# Altium footprint library ATROTECH.PcbLib: 334 footprints (part 9 of 21)
Each footprint in its own frame and in the unit in brackets; x right, y up, seen from the top. Pads: shape width x height; smd on the part's side, far side on the other; paste and mask are expansions set on the pad; w line width, h text height; cw(c..) or ccw(c..) is an arc to the next point about the centre after c.
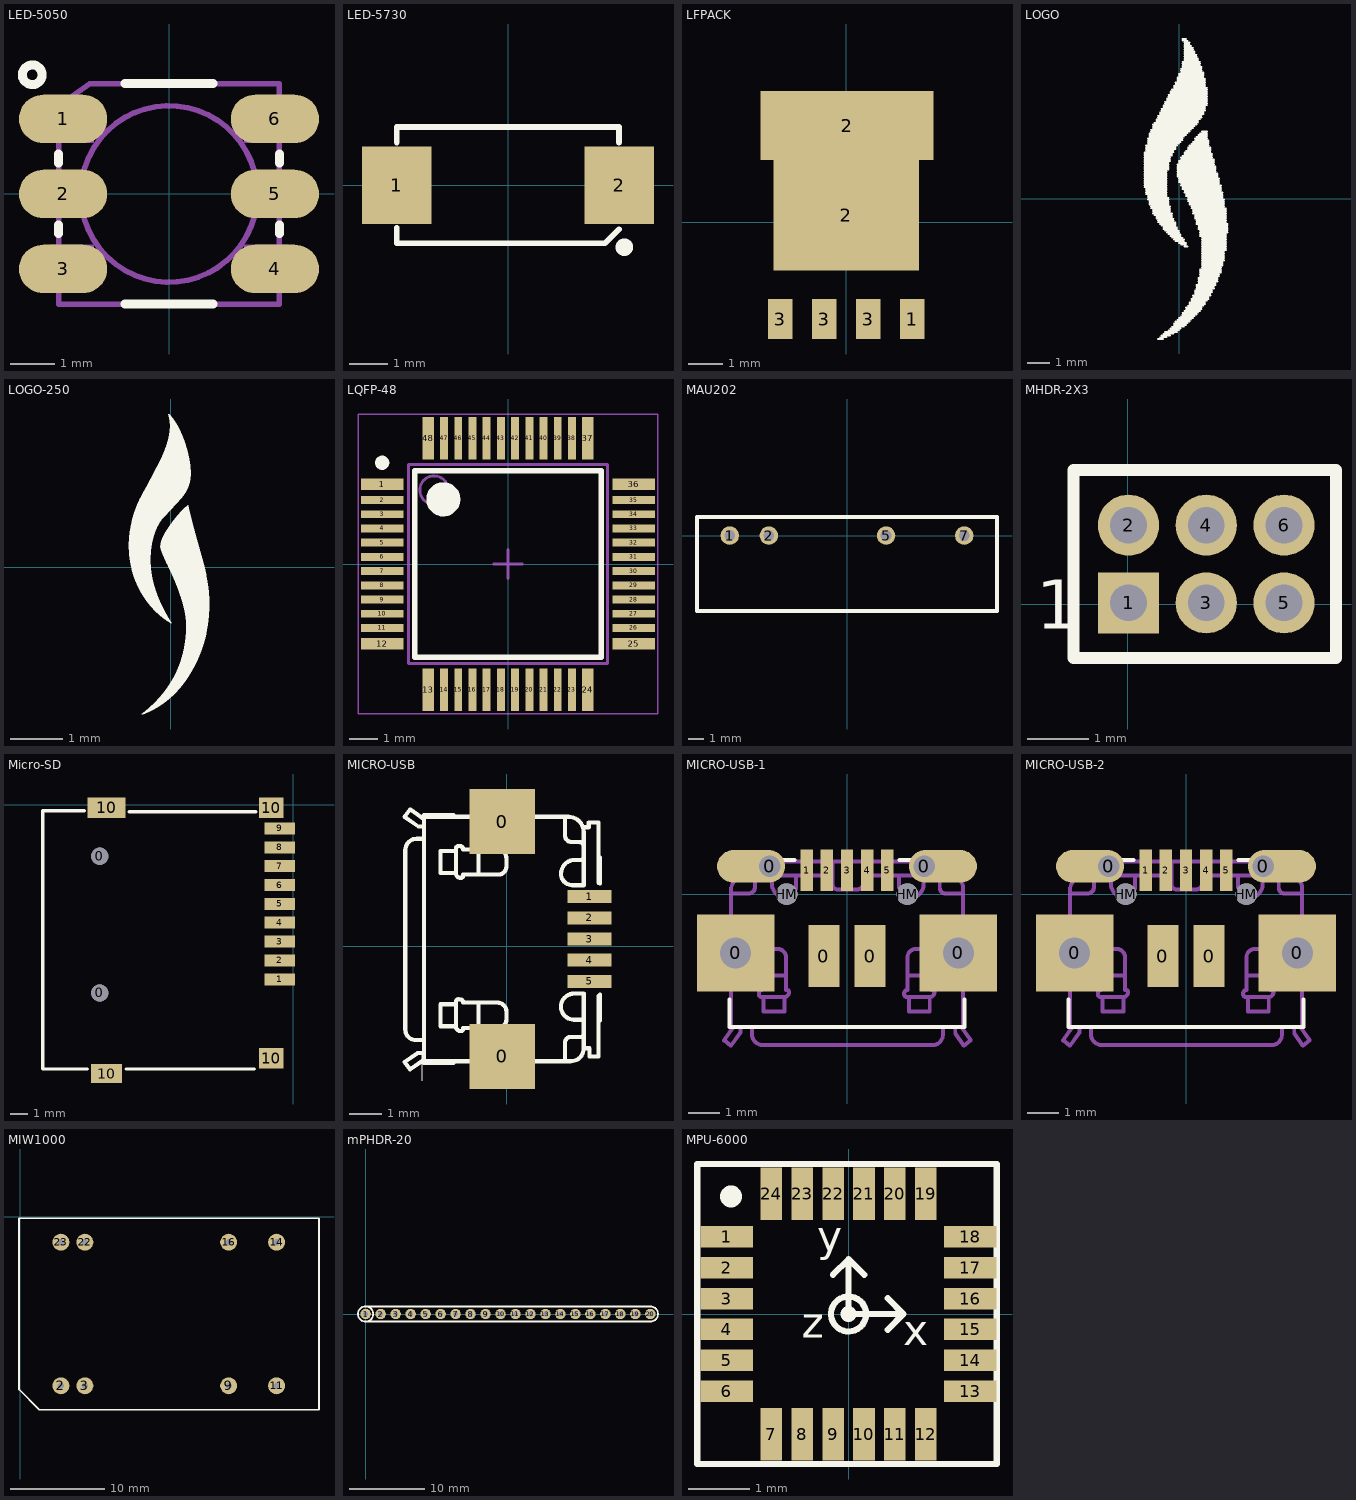
[diagram p8: the footprints below, top view; thin cyan lines are the x and y axes]

## LED-5050 [mm]
pads (6):
  rrect100% 2x1.1 smd: 1(-2.4,1.7) 2(-2.4,0) 3(-2.4,-1.7) 4(2.4,-1.7) 5(2.4,0) 6(2.4,1.7)
Top Overlay:
  circle w0.203: c-3.1,2.7 r0.224
  lines w0.203: -2.5,-0.9 -2.5,-0.7 ; -2.5,0.7 -2.5,0.9 ; -1,-2.5 1,-2.5 ; -1,2.5 1,2.5 ; 2.5,-0.9 2.5,-0.7 ; 2.5,0.7 2.5,0.9
Mechanical 16:
  circle w0.127: c0,0 r2
  rectangle: 1.7,-0.45 2.7,0.45
  rectangle: 1.7,1.15 2.7,2.05
  rectangle: 1.7,-2.05 2.7,-1.15
  region: -1.7,2.05 -2.7,2.05 -2.7,1.15 -1.7,1.15
  region: -1.7,0.45 -2.7,0.45 -2.7,-0.45 -1.7,-0.45
  region: -1.7,-1.15 -2.7,-1.15 -2.7,-2.05 -1.7,-2.05
  lines w0.127: -2.5,-2.5 -2.5,2 -1.8,2.5 2.5,2.5 2.5,-2.5 -2.5,-2.5
3D body "User Library-APA102C.step": height 1.4, standoff -0.15, extent -2.75,-2.5 2.75,2.5

## LED-5730 [mm]
pads (2):
  rect 1.8x2 smd: 1(-2.867,0) 2(2.867,0)
Top Overlay:
  circle w0.254: c3,-1.6 r0.1
  lines w0.15: -2.867,-1.1 -2.867,-1.5 2.5,-1.5 2.862,-1.138 ; -2.867,1.1 -2.867,1.5 2.862,1.5 2.862,1.1
Top Solder:
  rectangle: -1.7,-0.8 0.9,0.8
3D body "User Library-PLCC-2white.step": height 0.9, standoff 0, extent -2.85,-1.5 2.85,1.5

## Lens-Holder [mm]
3D body "Camera ABM-S420.SLDPRT": height 25, standoff -6, extent -16.76,-14.732 15.24,17.268

## LFPACK [mm]
pads (6):
  rect 0.7x1.15 smd: 1(1.905,-2.794) 3(-1.905,-2.794) 3(-0.635,-2.794) 3(0.635,-2.794)
  rect 4.2x3.2 smd: 2(0,0.206)
  rect 5x2 smd: 2(0.025,2.794)
3D body "lfpak.STEP": height 1.1, standoff -0.01, extent -2.485,-3.126 2.515,3.343

## LOGO [mm]
Top Overlay:
  drawing of 240 lines, arcs and shapes, not listed

## LOGO-250 [mm]
Top Overlay:
  drawing of 1676 lines, arcs and shapes, not listed

## LQFP-48 [mm]
pads (48):
  rect 1.5x0.4 smd: 1(-4.425,2.81) 12(-4.425,-2.81) 25(4.425,-2.81) 36(4.425,2.81)
  rect 1.5x0.28 smd: 2(-4.425,2.25) 3(-4.425,1.75) 4(-4.425,1.25) 5(-4.425,0.75) 6(-4.425,0.25) 7(-4.425,-0.25) 8(-4.425,-0.75) 9(-4.425,-1.25) 10(-4.425,-1.75) 11(-4.425,-2.25) 26(4.425,-2.25) 27(4.425,-1.75) 28(4.425,-1.25) 29(4.425,-0.75) 30(4.425,-0.25) 31(4.425,0.25) 32(4.425,0.75) 33(4.425,1.25) 34(4.425,1.75) 35(4.425,2.25)
  rect 0.4x1.5 smd: 13(-2.81,-4.425) 24(2.81,-4.425) 37(2.81,4.425) 48(-2.81,4.425)
  rect 0.28x1.5 smd: 14(-2.25,-4.425) 15(-1.75,-4.425) 16(-1.25,-4.425) 17(-0.75,-4.425) 18(-0.25,-4.425) 19(0.25,-4.425) 20(0.75,-4.425) 21(1.25,-4.425) 22(1.75,-4.425) 23(2.25,-4.425) 38(2.25,4.425) 39(1.75,4.425) 40(1.25,4.425) 41(0.75,4.425) 42(0.25,4.425) 43(-0.25,4.425) 44(-0.75,4.425) 45(-1.25,4.425) 46(-1.75,4.425) 47(-2.25,4.425)
Top Overlay:
  circle w0.6: c-2.275,2.275 r0.3
  circle w0.25: c-4.425,3.56 r0.125
  lines w0.2: -3.275,-3.275 3.275,-3.275 3.275,3.275 -3.275,3.275 -3.275,-3.275
Mechanical 13:
  circle w0.1: c-2.6,2.6 r0.5
  lines w0.1: -3.5,-3.5 3.5,-3.5 3.5,3.5 -3.5,3.5 -3.5,-3.5
Mechanical 15:
  lines w0.05: -5.275,-5.275 5.275,-5.275 5.275,5.275 -5.275,5.275 -5.275,-5.275
  lines w0.1: -0.5,0 0.5,0 ; 0,-0.5 0,0.5
3D body "User Library-LQFP48_Grid_0_5.STEP": height 1.6, standoff 0, extent -4.5,-4.5 4.5,4.5

## MAU202 [mm]
pads (4):
  round 1.2 hole 0.7: 1(-7.62,0) 2(-5.08,0) 5(2.54,0) 7(7.62,0)
Top Overlay:
  lines w0.254: -9.75,-4.9 -9.75,1.2 9.75,1.2 9.75,-4.9 -9.75,-4.9
3D body: height 10, standoff 0, extent -9.7,-4.9 9.7,1.2

## MHDR-2X3 [mm]
pads (6):
  rect 1x1 hole 0.6: 1(0.011,0.019)
  round 1 hole 0.6: 2(0.011,1.289) 3(1.281,0.019) 4(1.281,1.289) 5(2.551,0.019) 6(2.551,1.289)
Top Overlay:
  lines w0.2: -0.889,-0.881 -0.889,2.189 3.4,2.189 3.4,-0.881 -0.889,-0.881
  text "1" at -1.5,-0.4 h0.8

## Micro-SD [mm]
pads (15):
  round 1 hole 1: 0(-11.287,-10.985) 0(-11.287,-3.005)
  rect 1.8x0.7 smd: 1(-0.787,-10.185) 2(-0.787,-9.085) 3(-0.787,-7.985) 4(-0.787,-6.885) 5(-0.787,-5.785) 6(-0.787,-4.685) 7(-0.787,-3.585) 8(-0.787,-2.485) 9(-0.787,-1.385)
  rect 1.8x1.1 smd: 10(-10.887,-15.685)
  rect 2.2x1.2 smd: 10(-10.887,-0.185)
  rect 1.44x1.2 smd: 10(-1.287,-14.785) 10(-1.287,-0.185)
Top Overlay:
  lines w0.2: -12.192,-0.356 -14.605,-0.356 -14.605,-15.418 -12.014,-15.418 ; -9.754,-15.418 -2.261,-15.418 ; -9.576,-0.406 -2.184,-0.406
3D body "MicroSDSlot.STEP": height 1.75, standoff -0.69, extent -14.949,-15.924 0.051,0.076

## MICRO-USB [mm]
pads (7):
  rect 2x2 smd: 0(-0.135,-3.376) 0(-0.135,3.824)
  rect 1.35x0.4 smd: 1(2.54,1.524) 2(2.54,0.874) 3(2.54,0.224) 4(2.54,-0.426) 5(2.54,-1.076)
Top Overlay:
  lines w0: -2.585,-4.126 -2.585,-3.276
  lines w0.127: -2.585,-3.276 -2.735,-3.276 -3.135,-3.551 -2.96,-3.776 -2.535,-3.476 ; -1.635,-3.576 -2.535,-3.576 -2.535,4.024 -1.635,4.024 ; -1.56,-2.476 -1.56,-1.776 ; -1.56,2.224 -1.56,2.924 ; -0.86,-2.476 -0.86,-1.726 ; -0.86,2.224 -0.86,2.974 ; 1.79,-3.501 1.79,-2.951 cw(c1.965,-2.951) 1.965,-2.776 2.29,-2.776 ccw(c2.29,-2.701) 2.365,-2.701 ; 1.79,3.949 1.79,3.399 ccw(c1.99,3.399) 1.99,3.199 2.215,3.199 cw(c2.215,3.049) 2.365,3.049 ; 2.39,3.649 2.515,3.649 2.515,3.799 2.815,3.799 2.815,1.949 ; 2.815,-1.526 2.815,-3.376 2.54,-3.376 2.54,-3.126 2.365,-3.126 ; 2.865,-2.276 2.865,-1.476 ; 2.865,1.924 2.865,2.724 ; -2.535,-3.476 -2.535,-2.876 ; -2.535,-3.476 -2.535,-3.526 1.965,-3.526 ccw(c1.965,-3.126) 2.365,-3.126 ; -2.535,-2.876 -2.535,3.299 ; -2.535,-2.876 -2.785,-2.876 cw(c-2.785,-2.551) -3.11,-2.551 -3.11,2.949 cw(c-2.76,2.949) -2.76,3.299 -2.535,3.299 ; -2.535,3.299 -2.535,3.674 ; -2.535,3.674 -2.535,3.899 ; -2.535,3.674 -2.71,3.674 -3.135,3.974 -2.96,4.199 -2.535,3.899 ; -2.535,3.899 -2.535,3.974 1.89,3.974 cw(c1.89,3.499) 2.365,3.499 2.365,3.049 ; -1.56,-1.776 -1.56,-1.701 cw(c-1.472,-1.713) -1.46,-1.626 -1.435,-1.626 cw(c-1.435,-1.726) -1.335,-1.726 -0.86,-1.726 ; -1.56,-1.776 -2.035,-1.776 -2.035,-2.451 -1.56,-2.451 ccw(c-1.41,-2.451) -1.41,-2.601 ccw(c-1.41,-2.526) -1.335,-2.526 -1.335,-2.501 -0.26,-2.501 ccw(c-0.26,-2.251) -0.01,-2.251 -0.01,-2.001 ccw(c-0.285,-2.001) -0.285,-1.726 -0.86,-1.726 ; -1.56,2.924 -1.56,2.999 cw(c-1.473,2.986) -1.46,3.074 -1.435,3.074 cw(c-1.435,2.974) -1.335,2.974 -0.86,2.974 ; -1.56,2.924 -2.035,2.924 -2.035,2.249 -1.56,2.249 ccw(c-1.41,2.249) -1.41,2.099 ccw(c-1.41,2.174) -1.335,2.174 -1.335,2.199 -0.26,2.199 ccw(c-0.26,2.449) -0.01,2.449 -0.01,2.699 ccw(c-0.285,2.699) -0.285,2.974 -0.86,2.974 ; 2.365,-3.126 2.365,-2.701 ; 2.365,-2.701 2.365,-2.251 ; 2.365,-2.251 2.365,-1.451 2.065,-1.451 ccw(c2.065,-1.851) 1.665,-1.851 ccw(c2.065,-1.851) 2.065,-2.251 2.365,-2.251 ; 2.365,2.724 cw(c2.29,2.724) 2.29,2.649 2.09,2.649 ccw(c2.09,2.224) 1.665,2.224 ccw(c2.015,2.224) 2.015,1.874 2.365,1.874 2.365,2.724 ; 2.365,2.724 2.365,3.049
Mechanical 1:
  lines w0: -0.685,-3.376 ccw(c-0.41,-3.401) -0.435,-3.676 0.165,-3.676 ccw(c0.14,-3.401) 0.415,-3.376 ccw(c0.14,-3.351) 0.165,-3.076 -0.435,-3.076 ccw(c-0.41,-3.351) -0.685,-3.376 ; -0.685,3.824 ccw(c-0.41,3.799) -0.435,3.524 0.165,3.524 ccw(c0.14,3.799) 0.415,3.824 ccw(c0.14,3.849) 0.165,4.124 -0.435,4.124 ccw(c-0.41,3.849) -0.685,3.824
3D body "User Library-10104110.step": height 2.72, standoff -0.31, extent -2.715,-3.912 2.849,4.166

## MICRO-USB-1 [mm]
pads (13):
  rect 2.5x2.5 hole 1: 0(-3.6,-1.9) 0(3.6,-1.9)
  oval 2.2x1.05 hole 0.7 copper offset -0.6,0: 0(-2.5,0.9)
  rect 1x2 smd: 0(-0.75,-2) 0(0.75,-2)
  rrect100% 2.2x1.05 hole 0.7 copper offset 0.6,0: 0(2.5,0.9)
  rect 0.4x1.35 smd: 1(-1.3,0.775) 2(-0.65,0.775) 3(0,0.775) 4(0.65,0.775) 5(1.3,0.775)
  round 0.7 hole 0.7: HM(-1.95,0) HM(1.95,0)
Top Overlay:
  lines w0.127: -3.8,-3.4 -3.8,-4.3 3.8,-4.3 3.8,-3.4 ; -2.5,1.1 -1.7,1.1 ; 1.7,1.1 2.5,1.1
Mechanical 1:
  lines w0: -3.9,-2.2 ccw(c-3.625,-2.175) -3.6,-2.45 ccw(c-3.575,-2.175) -3.3,-2.2 -3.3,-1.6 ccw(c-3.575,-1.625) -3.6,-1.35 ccw(c-3.625,-1.625) -3.9,-1.6 -3.9,-2.2 ; 3.3,-2.2 ccw(c3.575,-2.175) 3.6,-2.45 ccw(c3.625,-2.175) 3.9,-2.2 3.9,-1.6 ccw(c3.625,-1.625) 3.6,-1.35 ccw(c3.575,-1.625) 3.3,-1.6 3.3,-2.2
Mechanical 16:
  lines w0.127: -3.725,0.025 -3.175,0.025 ccw(c-3.175,0.225) -2.975,0.225 -2.975,0.45 cw(c-2.825,0.45) -2.825,0.6 ; -3.425,0.625 -3.425,0.75 -3.575,0.75 -3.575,1.05 -0.475,1.05 ; -2,-3.325 -2.7,-3.325 ; -2,-2.625 -2.75,-2.625 ; -0.125,0.175 -0.125,0.65 0.1,0.65 0.1,0.175 ; 2.7,-3.325 2,-3.325 ; 2.7,-2.625 1.95,-2.625 ; 3.5,-4.35 3.5,-4.5 3.775,-4.9 4,-4.725 3.7,-4.3 ; 3.725,0.025 3.175,0.025 cw(c3.175,0.2) 3,0.2 3,0.525 ccw(c2.925,0.525) 2.925,0.6 ; -3.675,-4.3 -3.75,-4.3 -3.75,0.125 cw(c-3.275,0.125) -3.275,0.6 -2.825,0.6 ; -3.675,-4.3 -3.45,-4.3 ; -3.675,-4.3 -3.975,-4.725 -3.75,-4.9 -3.45,-4.475 -3.45,-4.3 ; -3.45,-4.3 -3.075,-4.3 ; -3.075,-4.3 3.1,-4.3 ; -3.075,-4.3 -3.075,-4.525 ccw(c-2.725,-4.525) -2.725,-4.875 2.775,-4.875 ccw(c2.775,-4.55) 3.1,-4.55 3.1,-4.3 ; -2.825,0.6 -2.5,0.6 ; -2.75,-2.625 -2.75,-3.1 ccw(c-2.75,-3.2) -2.85,-3.2 -2.85,-3.225 ccw(c-2.762,-3.238) -2.775,-3.325 -2.7,-3.325 ; -2.75,-2.625 -2.75,-2.05 cw(c-2.475,-2.05) -2.475,-1.775 -2.225,-1.775 cw(c-2.225,-2.025) -1.975,-2.025 -1.975,-3.1 -1.95,-3.1 cw(c-1.95,-3.175) -1.875,-3.175 cw(c-2.025,-3.175) -2.025,-3.325 -2.025,-3.8 -2.7,-3.8 -2.7,-3.325 ; -2.5,0.6 cw(c-2.5,0.525) -2.425,0.525 -2.425,0.325 ccw(c-2,0.325) -2,-0.1 ccw(c-2,0.25) -1.65,0.25 -1.65,0.6 ; -2.5,0.6 -1.65,0.6 ; -1.65,0.6 -0.475,0.6 ; -0.475,0.6 -0.475,0.325 ccw(c-0.3,0.325) -0.3,0.15 0.325,0.15 ccw(c0.325,0.35) 0.525,0.35 0.525,0.6 ; -0.475,0.6 -0.475,1.05 ; -0.475,1.05 0.525,1.05 ; 0.525,0.6 1.675,0.6 ; 0.525,0.6 0.525,1.05 ; 0.525,1.05 3.6,1.05 3.6,0.775 3.35,0.775 3.35,0.6 ; 1.675,0.6 2.475,0.6 ; 1.675,0.6 1.675,0.3 ccw(c2.075,0.3) 2.075,-0.1 ccw(c2.075,0.3) 2.475,0.3 2.475,0.6 ; 1.95,-2.625 1.95,-3.1 ccw(c1.95,-3.2) 1.85,-3.2 1.85,-3.225 ccw(c1.938,-3.237) 1.925,-3.325 2,-3.325 ; 1.95,-2.625 1.95,-2.05 cw(c2.225,-2.05) 2.225,-1.775 2.475,-1.775 cw(c2.475,-2.025) 2.725,-2.025 2.725,-3.1 2.75,-3.1 cw(c2.75,-3.175) 2.825,-3.175 cw(c2.675,-3.175) 2.675,-3.325 2.675,-3.8 2,-3.8 2,-3.325 ; 2.475,0.6 2.925,0.6 ; 2.925,0.6 3.35,0.6 ; 3.1,-4.3 3.7,-4.3 ; 3.35,0.6 cw(c3.35,0.2) 3.75,0.2 3.75,-4.3 3.7,-4.3
3D body "User Library-10118194.step": height 2.73, standoff -0.55, extent -4.025,-4.6 4.025,0.98

## MICRO-USB-2 [mm]
pads (13):
  rect 2.5x2.5 hole 1: 0(-3.6,-1.9) 0(3.6,-1.9)
  oval 2.2x1.05 hole 0.7 copper offset -0.6,0: 0(-2.5,0.9)
  rect 1x2 smd: 0(-0.75,-2) 0(0.75,-2)
  rrect100% 2.2x1.05 hole 0.7 copper offset 0.6,0: 0(2.5,0.9)
  rect 0.4x1.35 smd: 1(-1.3,0.775) 2(-0.65,0.775) 3(0,0.775) 4(0.65,0.775) 5(1.3,0.775)
  round 0.7 hole 0.7: HM(-1.95,0) HM(1.95,0)
Top Overlay:
  lines w0.127: -3.8,-3.4 -3.8,-4.3 3.8,-4.3 3.8,-3.4 ; -2.5,1.1 -1.7,1.1 ; 1.7,1.1 2.5,1.1
Mechanical 1:
  lines w0: -3.9,-2.2 ccw(c-3.625,-2.175) -3.6,-2.45 ccw(c-3.575,-2.175) -3.3,-2.2 -3.3,-1.6 ccw(c-3.575,-1.625) -3.6,-1.35 ccw(c-3.625,-1.625) -3.9,-1.6 -3.9,-2.2 ; 3.3,-2.2 ccw(c3.575,-2.175) 3.6,-2.45 ccw(c3.625,-2.175) 3.9,-2.2 3.9,-1.6 ccw(c3.625,-1.625) 3.6,-1.35 ccw(c3.575,-1.625) 3.3,-1.6 3.3,-2.2
Mechanical 16:
  lines w0.127: -3.725,0.025 -3.175,0.025 ccw(c-3.175,0.225) -2.975,0.225 -2.975,0.45 cw(c-2.825,0.45) -2.825,0.6 ; -3.425,0.625 -3.425,0.75 -3.575,0.75 -3.575,1.05 -0.475,1.05 ; -2,-3.325 -2.7,-3.325 ; -2,-2.625 -2.75,-2.625 ; -0.125,0.175 -0.125,0.65 0.1,0.65 0.1,0.175 ; 2.7,-3.325 2,-3.325 ; 2.7,-2.625 1.95,-2.625 ; 3.5,-4.35 3.5,-4.5 3.775,-4.9 4,-4.725 3.7,-4.3 ; 3.725,0.025 3.175,0.025 cw(c3.175,0.2) 3,0.2 3,0.525 ccw(c2.925,0.525) 2.925,0.6 ; -3.675,-4.3 -3.975,-4.725 -3.75,-4.9 -3.45,-4.475 -3.45,-4.3 ; -3.675,-4.3 -3.45,-4.3 ; -3.675,-4.3 -3.75,-4.3 -3.75,0.125 cw(c-3.275,0.125) -3.275,0.6 -2.825,0.6 ; -3.45,-4.3 -3.075,-4.3 ; -3.075,-4.3 -3.075,-4.525 ccw(c-2.725,-4.525) -2.725,-4.875 2.775,-4.875 ccw(c2.775,-4.55) 3.1,-4.55 3.1,-4.3 ; -3.075,-4.3 3.1,-4.3 ; -2.825,0.6 -2.5,0.6 ; -2.75,-2.625 -2.75,-2.05 cw(c-2.475,-2.05) -2.475,-1.775 -2.225,-1.775 cw(c-2.225,-2.025) -1.975,-2.025 -1.975,-3.1 -1.95,-3.1 cw(c-1.95,-3.175) -1.875,-3.175 cw(c-2.025,-3.175) -2.025,-3.325 -2.025,-3.8 -2.7,-3.8 -2.7,-3.325 ; -2.75,-2.625 -2.75,-3.1 ccw(c-2.75,-3.2) -2.85,-3.2 -2.85,-3.225 ccw(c-2.762,-3.238) -2.775,-3.325 -2.7,-3.325 ; -2.5,0.6 cw(c-2.5,0.525) -2.425,0.525 -2.425,0.325 ccw(c-2,0.325) -2,-0.1 ccw(c-2,0.25) -1.65,0.25 -1.65,0.6 ; -2.5,0.6 -1.65,0.6 ; -1.65,0.6 -0.475,0.6 ; -0.475,0.6 -0.475,1.05 ; -0.475,0.6 -0.475,0.325 ccw(c-0.3,0.325) -0.3,0.15 0.325,0.15 ccw(c0.325,0.35) 0.525,0.35 0.525,0.6 ; -0.475,1.05 0.525,1.05 ; 0.525,0.6 0.525,1.05 ; 0.525,0.6 1.675,0.6 ; 0.525,1.05 3.6,1.05 3.6,0.775 3.35,0.775 3.35,0.6 ; 1.675,0.6 1.675,0.3 ccw(c2.075,0.3) 2.075,-0.1 ccw(c2.075,0.3) 2.475,0.3 2.475,0.6 ; 1.675,0.6 2.475,0.6 ; 1.95,-2.625 1.95,-2.05 cw(c2.225,-2.05) 2.225,-1.775 2.475,-1.775 cw(c2.475,-2.025) 2.725,-2.025 2.725,-3.1 2.75,-3.1 cw(c2.75,-3.175) 2.825,-3.175 cw(c2.675,-3.175) 2.675,-3.325 2.675,-3.8 2,-3.8 2,-3.325 ; 1.95,-2.625 1.95,-3.1 ccw(c1.95,-3.2) 1.85,-3.2 1.85,-3.225 ccw(c1.938,-3.237) 1.925,-3.325 2,-3.325 ; 2.475,0.6 2.925,0.6 ; 2.925,0.6 3.35,0.6 ; 3.1,-4.3 3.7,-4.3 ; 3.35,0.6 cw(c3.35,0.2) 3.75,0.2 3.75,-4.3 3.7,-4.3
3D body "User Library-10118194.step": height 2.73, standoff -0.55, extent -4.025,-4.6 4.025,0.98

## MIW1000 [mm] "DC/DC CONVERTER"
pads (8):
  round 1.8 hole 0.7: 2(4.318,-17.907) 3(6.858,-17.907) 9(22.098,-17.907) 11(27.178,-17.907) 14(27.178,-2.687) 16(22.098,-2.687) 22(6.858,-2.687) 23(4.318,-2.687)
Top Overlay:
  lines w0.2: -0.127,-0.147 -0.127,-18.288 2.032,-20.447 31.673,-20.447 ; -0.072,-0.147 31.678,-0.147 31.678,-20.447

## mPHDR-20 [mm]
pads (20):
  round 1.4 hole 0.7: 1(0,0) 2(2,0) 3(4,0) 4(6,0) 5(8,0) 6(10,0) 7(12,0) 8(14,0) 9(16,0) 10(18,0) 11(20,0) 12(22,0) 13(24,0) 14(26,0) 15(28,0) 16(30,0) 17(32,0) 18(34,0) 19(36,0) 20(38,0)
Top Overlay:
  circle w0.254: c0,0 r1.016
  lines w0.254: 0,-1.016 38,-1.016 ccw(c38,0) 38,1.016 0,1.016

## MPU-6000 [mm] "MPU-6000/MPU-6050"
pads (24):
  rect 0.85x0.35 smd mask+0: 1(-1.975,1.25) 2(-1.975,0.75) 3(-1.975,0.25) 4(-1.975,-0.25) 5(-1.975,-0.75) 6(-1.975,-1.25) 13(1.975,-1.25) 14(1.975,-0.75) 15(1.975,-0.25) 16(1.975,0.25) 17(1.975,0.75) 18(1.975,1.25)
  rect 0.35x0.85 smd mask+0: 7(-1.25,-1.95) 8(-0.75,-1.95) 9(-0.25,-1.95) 10(0.25,-1.95) 11(0.75,-1.95) 12(1.25,-1.95) 19(1.25,1.95) 20(0.75,1.95) 21(0.25,1.95) 22(-0.25,1.95) 23(-0.75,1.95) 24(-1.25,1.95)
Top Overlay:
  circle w0.254: c-1.905,1.905 r0.05
  circle w0.254: c-0.001,0 r0.001
  circle w0.1: c0,0 r0.284
  lines w0.1: -0.254,0.635 0,0.889 ; 0.254,0.635 0,0.889 ; 0.635,-0.254 0.889,0 ; 0.635,0.254 0.889,0 ; 0,0.889 0,0 0.889,0 ; -2.45,-2.43 2.4,-2.43 2.4,2.43 -2.45,2.43 -2.45,-2.43
  text "z" at -0.762,-0.381 h0.5
  text "x" at 0.889,-0.508 h0.5
  text "y" at -0.508,1.016 h0.5